# Altium footprint library bethu.PcbLib: 628 footprints (part 18 of 40)
Each footprint in its own frame and in the unit in brackets; x right, y up, seen from the top. Pads: shape width x height; smd on the part's side, far side on the other; paste and mask are expansions set on the pad; w line width, h text height; cw(c..) or ccw(c..) is an arc to the next point about the centre after c.
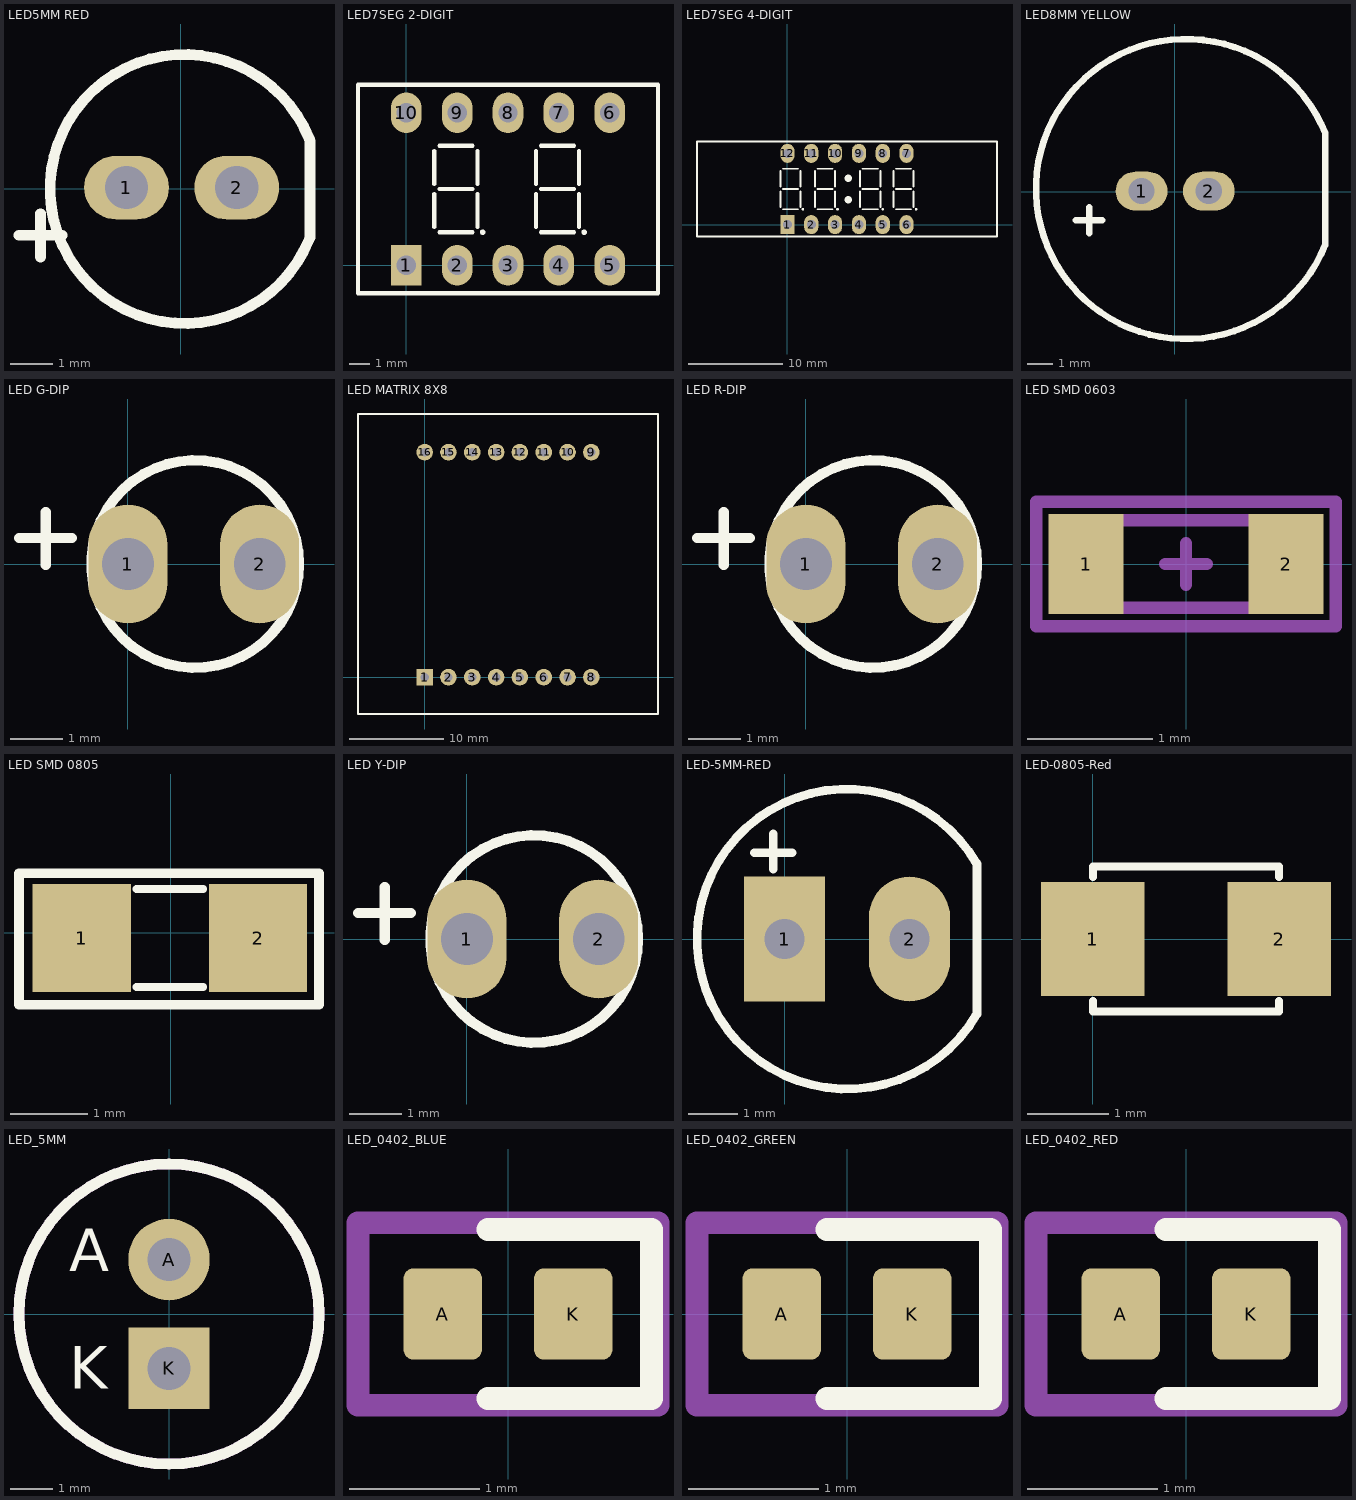
[diagram p17: the footprints below, top view; thin cyan lines are the x and y axes]

## LED5MM RED [mm] "Led de 5mm rojo"
pads (2):
  oval 2x1.5 hole 1.016: 1(-1.275,0.025) 2(1.325,0.025)
Top Overlay:
  lines w0.254: -3.808,-1.1 -2.792,-1.1 ; -3.3,-1.608 -3.3,-1.1 -3.3,-0.592 ; 3.034,-1.192 cw(c0.094,-0.008) 3.039,1.165 ; 3.05,-1.15 3.05,1.125
3D body "LEDd5R.STEP": height 12.31, standoff -2.49, extent -2.885,-2.875 2.535,3.145

## LED7SEG 2-DIGIT [mil]
pads (10):
  rect 60x80 hole 38: 1(0,0)
  oval 60x80 hole 38: 2(100,0) 3(200,0) 4(300,0) 5(400,0) 6(400,300) 7(300,300) 8(200,300) 9(100,300) 10(0,300)
Top Overlay:
  circle w10: c349.61,65 r0.39
  circle w10: c150,65 r0.39
  lines w8: 55,75 55,140 ; 55,160 55,225 ; 65,65 130,65 ; 65,150 130,150 ; 65,235 130,235 ; 140,75 140,140 ; 140,160 140,225 ; 255,75 255,140 ; 255,160 255,225 ; 265,65 330,65 ; 265,150 330,150 ; 265,235 330,235 ; 340,75 340,140 ; 340,160 340,225 ; -95,-55 495,-55 495,355 -95,355 -95,-55

## LED7SEG 4-DIGIT [mil]
pads (12):
  rect 60x80 hole 38: 1(0,0)
  oval 60x80 hole 38: 2(100,0) 3(200,0) 4(300,0) 5(400,0) 6(500,0) 7(500,300) 8(400,300) 9(300,300) 10(200,300) 11(100,300) 12(0,300)
Top Overlay:
  circle w30: c255,105 r0.39
  circle w30: c255,195 r0.39
  circle w10: c400,65 r0.39
  circle w10: c540,65 r0.39
  circle w10: c210,65 r0.39
  circle w10: c65,65 r0.39
  lines w8: -30,75 -30,140 ; -30,160 -30,225 ; -20,65 45,65 ; -20,150 45,150 ; -20,235 45,235 ; 55,75 55,140 ; 55,160 55,225 ; 115,75 115,140 ; 115,160 115,225 ; 125,65 190,65 ; 125,150 190,150 ; 125,235 190,235 ; 200,75 200,140 ; 200,160 200,225 ; 305,75 305,140 ; 305,160 305,225 ; 315,65 380,65 ; 315,150 380,150 ; 315,235 380,235 ; 390,75 390,140 ; 390,160 390,225 ; 445,75 445,140 ; 445,160 445,225 ; 455,65 520,65 ; 455,150 520,150 ; 455,235 520,235 ; 530,75 530,140 ; 530,160 530,225 ; -380,-50 880,-50 880,350 -380,350 -380,-50
3D body "User Library-7seg4digit_028.STEP": height 385.83, standoff -66.93, extent -379.92,-50 879.93,347.64

## LED8MM YELLOW [mm] "Led de 8mm amarillo"
pads (2):
  oval 2x1.5 hole 1.016: 1(-1.275,0.025) 2(1.325,0.025)
Top Overlay:
  lines w0.254: -3.808,-1.1 -2.792,-1.1 ; -3.3,-1.608 -3.3,-1.1 -3.3,-0.592 ; 5.817,-2.059 cw(c0.442,0.106) 5.825,2.25 ; 5.825,-2.05 5.825,2.225
3D body "LED d11.STEP": height 15.5, standoff -27, extent -5.05,-5.401 5.55,5.575

## LED G-DIP [mil]
pads (2):
  oval 60x90 hole 39.37 unplated: 1(0,0) 2(100,0)
Top Overlay:
  circle w7.87: c51.01,0 r78.74
  lines w7.87: -82.68,19.68 -42.68,19.68 ; -62.36,-0.63 -62.36,39.37
3D body "User Library-LED-D3G.STEP": height 181.1, standoff -255.91, extent -28.74,-78.74 115.61,78.74

## LED MATRIX 8X8 [mil]
pads (16):
  rect 70x70 hole 35: 1(0,0)
  round 70 hole 35: 2(100,0) 3(200,0) 4(300,0) 5(400,0) 6(500,0) 7(600,0) 8(700,0) 9(700,944.88) 10(600,944.88) 11(500,944.88) 12(400,944.88) 13(300,944.88) 14(200,944.88) 15(100,944.88) 16(0,944.88)
Top Overlay:
  lines w10: -280,-155 -280,1105 980,1105 980,-155 -280,-155
3D body "User Library-Bicolor-LED-Matrix.STEP": height 315, standoff -236.22, extent -279.91,-154.91 979.93,1104.93

## LED R-DIP [mil]
pads (2):
  oval 60x90 hole 39.37 unplated: 1(0,0) 2(100,0)
Top Overlay:
  circle w7.87: c51.01,0 r78.74
  lines w7.87: -82.68,19.68 -42.68,19.68 ; -62.36,-0.63 -62.36,39.37
3D body "User Library-LED-D3R.STEP": height 181.1, standoff -255.91, extent -28.74,-78.74 115.61,78.74

## LED SMD 0603 [mm] "Chip Resistor, Empaque 0603"
height 0.3
pads (2):
  rect 0.6x0.8 smd: 1(-0.8,0) 2(0.8,0)
Mechanical 13:
  lines w0.1: -0.8,-0.35 0.8,-0.35 0.8,0.35 -0.8,0.35 -0.8,-0.35
Mechanical 15:
  lines w0.1: -0.165,0 0.165,0 ; 0,-0.165 0,0.165 ; -1.2,-0.5 1.2,-0.5 1.2,0.5 -1.2,0.5 -1.2,-0.5
3D body "SW3dPS-LED SMD0603.STEP": height 0.68, standoff 0, extent -0.825,-0.344 0.825,0.381

## LED SMD 0805 [mil] "Compoment SMD 80x50mil"
height 50
pads (2):
  rect 50x55 smd: 1(-45.39,-2.58) 2(44.61,-2.58)
Top Overlay:
  lines w4: -17.39,-27.58 16.61,-27.58 ; -17.39,22.42 16.61,22.42
  lines w5: -77.39,-36.58 -77.39,30.42 75.61,30.42 75.61,-36.58 -77.39,-36.58
3D body "SW3dPS-LED SMD0805.STEP": height 33.45, standoff 0.23, extent -40.6,-20.68 40.6,15

## LED Y-DIP [mil]
pads (2):
  oval 60x90 hole 39.37 unplated: 1(0,0) 2(100,0)
Top Overlay:
  circle w7.87: c51.01,0 r78.74
  lines w7.87: -82.68,19.68 -42.68,19.68 ; -62.36,-0.63 -62.36,39.37
3D body "User Library-LED-D3Y.STEP": height 181.1, standoff -255.91, extent -28.74,-78.74 115.61,78.74

## LED-5MM-RED [mil] "LED 2 PIN, 5 ly , Only colour,pin to pin 100mil"
height 300
pads (2):
  rect 65x100 hole 32: 1(0,0)
  oval 65x100 hole 32: 2(100,0)
Top Overlay:
  lines w7: -24,69 6,69 ; -9,56 -9,84 ; 153.51,60.71 ccw(c50,0) 153.94,-59.97 ; 154,-59 154,60
3D body "SW3dPS-LEDd5R.STEP": height 339.18, standoff -243.49, extent -64.69,-119 148.69,117.99

## LED-0805-Red [mil]
pads (2):
  rect 50x55 smd: 1(0,0) 2(90,0)
Top Overlay:
  lines w4: 0,-30 0,-35 90,-35 90,-30 ; 0,30 0,35 90,35 90,30
3D body "User Library-led_0805-red.step": height 43.31, standoff 0, extent 5.25,-24.6 84.77,24.62

## LED_5MM [mm]
pads (2):
  round 1.9 hole 1: A(0,1.27)
  rect 1.9x1.9 hole 1: K(0,-1.27)
Top Overlay:
  circle w0.254: c0,0 r3.5
  text "K" at -2.333,-1.75 h1
  text "A" at -2.333,1 h1
Bottom Overlay:
  circle w0.254: c0,0 r3.5
  text "A" at -1.667,1 h1
  text "K" at -1.667,-1.75 h1
Mechanical 13:
  circle w0.254: c0,0 r3.5
  text "K" at -0.333,-1.75 h1
  text "A" at -0.333,1 h1
  text "'.Designator'" at -5.665,-0.417 h1
3D body "LED-5mm.STEP": height 21.8, standoff -14, extent -3.459,-5.5 2.54,0

## LED_0402_BLUE [mm]
pads (2):
  rrect25% 0.6x0.7 smd: A(-0.5,0) K(0.5,0)
Top Overlay:
  lines w0.175: -0.153,-0.647 1.1,-0.647 1.1,0.647 -0.153,0.647
Mechanical 13:
  lines w0.175: -1.15,-0.7 -1.15,0.7 1.15,0.7 1.15,-0.7 -1.15,-0.7
  text "+" at -1.883,0.508 h0.5
  text "'.Designator'" at -5.665,-0.29 h1
3D body "LED0402-Blue.step": height 0.45, standoff 0, extent -0.505,-0.25 0.505,0.25

## LED_0402_GREEN [mm]
pads (2):
  rrect25% 0.6x0.7 smd: A(-0.5,0) K(0.5,0)
Top Overlay:
  lines w0.175: -0.153,-0.647 1.1,-0.647 1.1,0.647 -0.153,0.647
Mechanical 13:
  lines w0.175: -1.15,-0.7 -1.15,0.7 1.15,0.7 1.15,-0.7 -1.15,-0.7
  text "'.Designator'" at -5.665,-0.29 h1
  text "+" at -1.883,0.508 h0.5
3D body "LED0402-Green.step": height 0.45, standoff 0, extent -0.505,-0.25 0.505,0.25

## LED_0402_RED [mm]
pads (2):
  rrect25% 0.6x0.7 smd: A(-0.5,0) K(0.5,0)
Top Overlay:
  lines w0.175: -0.153,-0.647 1.1,-0.647 1.1,0.647 -0.153,0.647
Mechanical 13:
  lines w0.175: -1.15,-0.7 1.15,-0.7 1.15,0.7 -1.15,0.7 -1.15,-0.7
  text "'.Designator'" at -5.665,-0.29 h1
  text "+" at -1.883,0.508 h0.5
3D body "LED0402-Red.step": height 0.45, standoff 0, extent -0.505,-0.25 0.505,0.25